# Altium footprint library GBA.PcbLib: 115 footprints (part 7 of 8)
Each footprint in its own frame and in the unit in brackets; x right, y up, seen from the top. Pads: shape width x height; smd on the part's side, far side on the other; paste and mask are expansions set on the pad; w line width, h text height; cw(c..) or ccw(c..) is an arc to the next point about the centre after c.
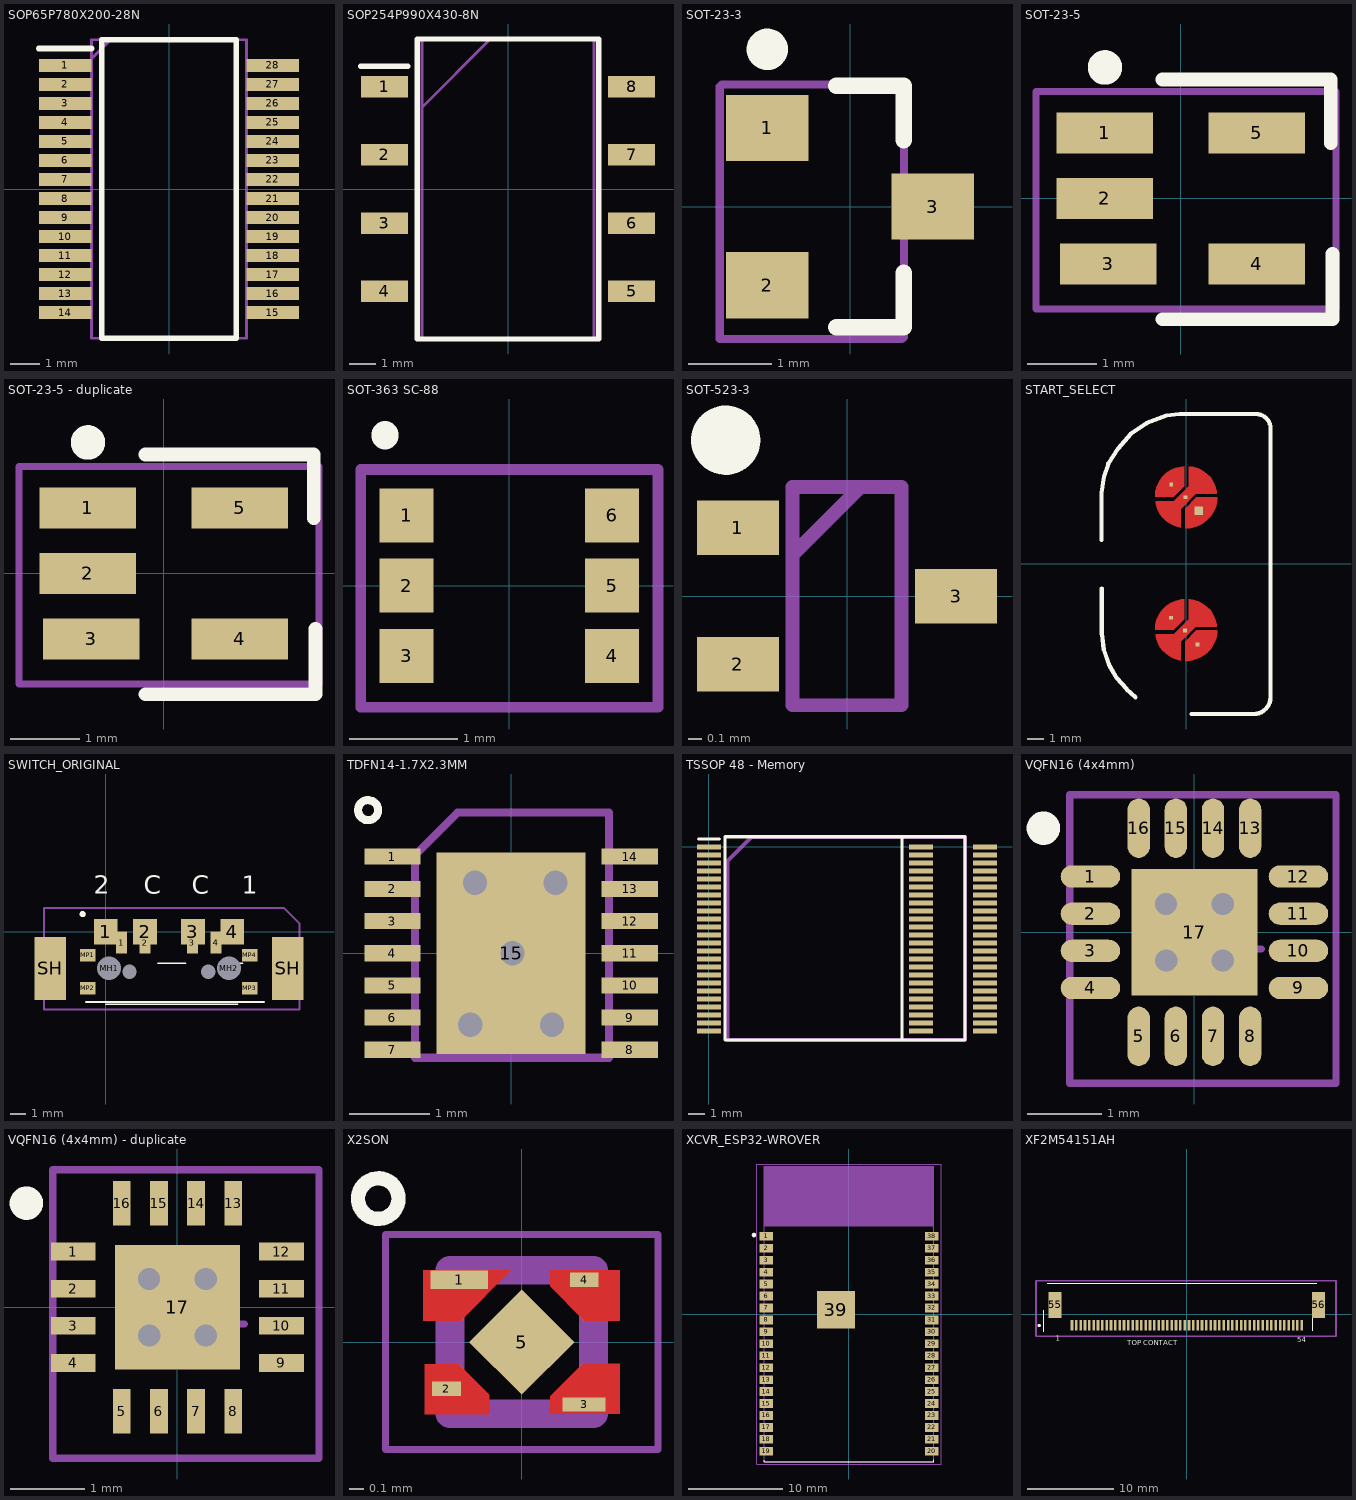
[diagram p6: the footprints below, top view; thin cyan lines are the x and y axes]

## SOP65P780X200-28N [mm]
pads (28):
  rect 1.8x0.45 smd: 1(-3.55,4.225) 2(-3.55,3.575) 3(-3.55,2.925) 4(-3.55,2.275) 5(-3.55,1.625) 6(-3.55,0.975) 7(-3.55,0.325) 8(-3.55,-0.325) 9(-3.55,-0.975) 10(-3.55,-1.625) 11(-3.55,-2.275) 12(-3.55,-2.925) 13(-3.55,-3.575) 14(-3.55,-4.225) 15(3.55,-4.225) 16(3.55,-3.575) 17(3.55,-2.925) 18(3.55,-2.275) 19(3.55,-1.625) 20(3.55,-0.975) 21(3.55,-0.325) 22(3.55,0.325) 23(3.55,0.975) 24(3.55,1.625) 25(3.55,2.275) 26(3.55,2.925) 27(3.55,3.575) 28(3.55,4.225)
Top Overlay:
  lines w0.2: -4.45,4.8 -2.65,4.8 ; -2.3,-5.1 2.3,-5.1 2.3,5.1 -2.3,5.1 -2.3,-5.1
Top Designator:
  lines w0.1: -2.65,4.45 -2,5.1 ; -2.65,-5.1 2.65,-5.1 2.65,5.1 -2.65,5.1 -2.65,-5.1
  text ".Designator" at 0.066,-1.905 h1
3D body "PCM2704CDBR.stp": height 1.9, standoff 0, extent -3.9,-5.1 3.9,5.1

## SOP254P990X430-8N [mm]
pads (8):
  rect 1.75x0.8 smd: 1(-4.6,3.81) 2(-4.6,1.27) 3(-4.6,-1.27) 4(-4.6,-3.81) 5(4.6,-3.81) 6(4.6,-1.27) 7(4.6,1.27) 8(4.6,3.81)
Top Overlay:
  lines w0.2: -5.475,4.56 -3.725,4.56 ; -3.375,-5.58 -3.375,5.58 3.375,5.58 3.375,-5.58 -3.375,-5.58
Top Designator:
  lines w0.1: -3.2,3.04 -0.66,5.58 ; -3.2,-5.58 3.2,-5.58 3.2,5.58 -3.2,5.58 -3.2,-5.58
  text ".Designator" at -0.569,-1.397 h1
3D body "CUI_DEVICES_DS04-254-2-04BK-SMT.step": height -0.39, standoff -4.39, extent -4.696,-5.572 5.204,5.588

## SOT-23-3 [mm] "SOT23, 3-Leads, Body 2.92x1.3mm, Pitch 0.95mm"
height 1.11
pads (3):
  rect 1x0.8 smd: 1(-1,0.95) 2(-1,-0.95) 3(1,0)
Top Overlay:
  circle w0.25: c-1,1.9 r0.125
  lines w0.2: -0.165,-1.46 0.65,-1.46 0.65,-0.8 ; -0.165,1.46 0.65,1.46 0.65,0.8
Top Designator (Mech29):
  lines w0.1: -1.575,-1.6 0.625,-1.6 0.65,-1.575 0.65,1.475 -1.55,1.475 -1.575,1.45 -1.575,-1.6
  text ".Designator" at -0.8,1.125 h1
3D body "SOT23-3.step": height 1.3, standoff 0, extent -1.4,-1.45 1.4,1.45

## SOT-23-5 [mm] "SOT23, 3-Leads, Body 2.92x1.3mm, Pitch 0.95mm"
height 1.11
pads (5):
  rect 1.4x0.6 smd: 1(-1.1,0.95) 2(-1.1,0) 3(-1.05,-0.95) 4(1.1,-0.95) 5(1.1,0.95)
Top Overlay:
  circle w0.25: c-1.1,1.9 r0.125
  lines w0.2: -0.265,-1.75 2.2,-1.75 2.2,-0.8 ; -0.265,1.725 2.175,1.725 2.175,0.8
Top Designator (Mech29):
  lines w0.1: -2.1,-1.6 2.25,-1.6 2.25,1.55 -2.1,1.55 -2.1,-1.6
  text ".Designator" at -0.9,1.125 h1
3D body "SOT-23-5.step": height 1.05, standoff -0.05, extent -1.175,-1.5 1.325,1.5

## SOT-23-5 - duplicate [mm] "SOT23, 3-Leads, Body 2.92x1.3mm, Pitch 0.95mm"
height 1.11
pads (5):
  rect 1.4x0.6 smd: 1(-1.1,0.95) 2(-1.1,0) 3(-1.05,-0.95) 4(1.1,-0.95) 5(1.1,0.95)
Top Overlay:
  circle w0.25: c-1.1,1.9 r0.125
  lines w0.2: -0.265,-1.75 2.2,-1.75 2.2,-0.8 ; -0.265,1.725 2.175,1.725 2.175,0.8
Top Designator (Mech29):
  lines w0.1: -2.1,-1.6 2.25,-1.6 2.25,1.55 -2.1,1.55 -2.1,-1.6
  text ".Designator" at -0.9,1.125 h1
3D body "SOT-23-5.step": height 1.05, standoff -0.05, extent -1.175,-1.5 1.325,1.5

## SOT-363 SC-88 [mm] "SOT23, 3-Leads, Body 2.92x1.3mm, Pitch 0.95mm"
height 1.11
pads (6):
  rect 0.5x0.5 smd: 1(-0.95,0.65) 2(-0.95,0) 3(-0.95,-0.65) 4(0.95,-0.65) 5(0.95,0) 6(0.95,0.65)
Top Overlay:
  lines w0.25: -1.151,1.384 ccw(c-1.275,1.4) -1.15,1.4
Top Designator (Mech29):
  lines w0.1: -1.375,-1.125 1.375,-1.125 1.375,1.075 -1.375,1.075 -1.375,-1.125
  text ".Designator" at -0.75,0.825 h1
3D body "SC88-6 sot363.step": height 1.1, standoff 0, extent -1.1,-1 1.1,1

## SOT-523-3 [mm]
pads (3):
  rect 0.6x0.4 smd: 1(-0.8,0.5) 2(-0.8,-0.5) 3(0.8,0)
Top Overlay:
  circle w0.254: c-0.889,1.143 r0.127
Top Designator (Mech29):
  lines w0.1: -0.4,0.3 0.1,0.8 ; -0.4,-0.8 -0.4,0.8 0.4,0.8 0.4,-0.8 -0.4,-0.8
  text ".Designator" at -1.397,-0.381 h1
3D body "DMG1012T-7.stp": height 0.8, standoff 0, extent -0.8,-0.8 0.8,0.8

## START_SELECT [mm]
pads (6):
  rect 0.23x0.23 smd: GND(-0.919,-3.263) GND(-0.896,4.756) GND(0.689,-4.871) SEL(-0.069,-4.021) STR(-0.046,3.998)
  rect 0.5x0.5 smd: GND(0.762,3.175)
Top Layer:
  region: -1.846,3.753 -0.744,3.753 0.154,4.65 0.154,5.844 0.281,5.844 0.434,5.824 0.729,5.733 1.004,5.594 1.252,5.41 1.465,5.187 1.637,4.931 1.764,4.65 1.841,4.351 1.854,4.198 0.584,4.198 -0.314,3.278 -0.314,2.159 -0.453,2.183 -0.721,2.27 -0.972,2.397 -1.202,2.559 -1.406,2.753 -1.578,2.976 -1.716,3.221 -1.816,3.485 -1.846,3.622
  region: -0.053,2.13 -0.053,3.289 0.616,3.982 1.872,3.982 1.868,3.806 1.795,3.46 1.659,3.133 1.466,2.838 1.221,2.583 0.934,2.377 0.613,2.228 0.271,2.141 0.094,2.13
  region: -1.868,4.014 -0.749,4.014 -0.131,4.657 -0.131,5.849 -0.295,5.842 -0.616,5.769 -0.919,5.64 -1.194,5.459 -1.432,5.231 -1.626,4.964 -1.768,4.667 -1.854,4.349 -1.868,4.185
  region: -1.846,-4.244 -0.744,-4.244 0.154,-3.346 0.154,-2.153 0.281,-2.153 0.434,-2.172 0.729,-2.263 1.004,-2.402 1.252,-2.586 1.465,-2.809 1.637,-3.065 1.764,-3.346 1.841,-3.645 1.854,-3.799 0.584,-3.799 -0.314,-4.718 -0.314,-5.837 -0.453,-5.813 -0.721,-5.726 -0.972,-5.599 -1.202,-5.437 -1.406,-5.243 -1.578,-5.02 -1.716,-4.775 -1.816,-4.512 -1.846,-4.374
  region: -0.053,-5.866 -0.053,-4.707 0.616,-4.014 1.872,-4.014 1.868,-4.19 1.795,-4.536 1.659,-4.862 1.466,-5.158 1.221,-5.413 0.934,-5.619 0.613,-5.768 0.271,-5.855 0.094,-5.866
  region: -1.868,-3.982 -0.749,-3.982 -0.131,-3.339 -0.131,-2.148 -0.295,-2.154 -0.616,-2.227 -0.919,-2.356 -1.194,-2.537 -1.432,-2.765 -1.626,-3.032 -1.768,-3.329 -1.854,-3.647 -1.868,-3.811
Top Overlay:
  lines w0.253: -5.101,1.425 -5.101,4.251 -4.94,5.239 -4.687,6.02 -4.09,6.939 -3.332,7.812 -2.39,8.456 -1.195,8.915 -0.391,9.007 4.205,9.007 cw(c4.205,8.134) 5.078,8.134 5.078,-8.042 cw(c4.067,-8.042) 4.067,-9.053 0.322,-9.053 ; -5.078,-1.494 -5.078,-4.251 -4.963,-5.17 -4.618,-6.158 -4.182,-6.893 -3.584,-7.56 -3.056,-8.042
Top Designator:
  text ".Designator" at 0.635,-3.81 h2

## SWITCH_ORIGINAL [mm]
pads (18):
  rect 1.5x1.6 smd: 1(0,0) 2(2.489,0) 3(5.537,0) 4(8.026,0)
  rect 0.7x1.4 smd: 1(1.002,-0.69) 2(2.502,-0.69) 3(5.502,-0.69) 4(7.002,-0.69)
  round 1.27 hole 1.5 unplated: MH1(0.203,-2.324) MH2(7.823,-2.324)
  round 0.45 hole 0.9 unplated: MH1(1.502,-2.54) MH2(6.502,-2.54)
  rect 1x0.8 smd: MP1(-1.148,-1.49) MP2(-1.148,-3.59) MP3(9.152,-3.59) MP4(9.152,-1.49)
  rect 2x4 smd: SH(-3.518,-2.324) SH(11.544,-2.324)
Top Overlay:
  lines w0.1: -0.309,-2.002 0.591,-2.002 ; -0.009,-4.602 8.391,-4.602 ; 3.291,-2.002 5.091,-2.002 ; 7.791,-2.002 8.691,-2.002
  lines w0.127: -1.253,-4.473 10.05,-4.473
  lines w0.2: -1.576,1.122 cw(c-1.476,1.122) -1.376,1.122 cw(c-1.476,1.122) -1.576,1.122
  text "1" at 8.636,2.032 h2
  text "2" at -0.762,2.032 h2
  text "C" at 2.413,2.032 h2
  text "C" at 5.461,2.032 h2
Top Designator:
  lines w0.127: -3.937,-4.953 -3.937,-3.683 -3.937,1.524 11.303,1.524 12.319,0.508 12.319,-4.953 -3.937,-4.953
  text ".Designator" at 2.413,-3.302 h1
3D body "EG1315AA.stp": height 1.41, standoff -0.49, extent -1.299,-5.253 9.401,-0.353

## TDFN14-1.7X2.3MM [mm] "T1433+2C Maxim code"
height 1.1
pads (15):
  rect 0.7x0.2 smd: 1(-1.475,1.2) 2(-1.475,0.8) 3(-1.475,0.4) 4(-1.475,0) 5(-1.475,-0.4) 6(-1.475,-0.8) 7(-1.475,-1.2) 8(1.475,-1.2) 9(1.475,-0.8) 10(1.475,-0.4) 11(1.475,0) 12(1.475,0.4) 13(1.475,0.8) 14(1.475,1.2)
  rect 1.85x2.5 smd: 15(0,0)
via 0.015,0 diameter 0.5 hole 0.3
via 0.508,-0.889 diameter 0.5 hole 0.3
via -0.508,-0.889 diameter 0.5 hole 0.3
via 0.55,0.875 diameter 0.5 hole 0.3
via -0.45,0.875 diameter 0.5 hole 0.3
Top Overlay:
  circle w0.1: c-1.778,1.778 r0.125
Top Designator (Mech29):
  lines w0.1: -1.195,-1.299 -1.195,1.218 -0.664,1.749 1.218,1.749 1.218,-1.299 -1.195,-1.299
  text ".Designator" at 0.329,-1.045 h1
3D body "MAXIM-TDFN-EP-14.step": height 0.73, standoff -0.03, extent -1.535,-1.5 1.475,1.5

## TSSOP 48 - Memory [mm]
pads (72):
  rect 1.5x0.3 smd: 1(0,0) 2(0,-0.5) 3(0,-1) 4(0,-1.5) 5(0,-2) 6(0,-2.5) 7(0,-3) 8(0,-3.5) 9(0,-4) 10(0,-4.5) 11(0,-5) 12(0,-5.5) 13(0,-6) 14(0,-6.5) 15(0,-7) 16(0,-7.5) 17(0,-8) 18(0,-8.5) 19(0,-9) 20(0,-9.5) 21(0,-10) 22(0,-10.5) 23(0,-11) 24(0,-11.5) 25(13.25,-11.5) 25(17.25,-11.5) 26(13.25,-11) 26(17.25,-11) 27(13.25,-10.5) 27(17.25,-10.5) 28(13.25,-10) 28(17.25,-10) 29(13.25,-9.5) 29(17.25,-9.5) 30(13.25,-9) 30(17.25,-9) 31(13.25,-8.5) 31(17.25,-8.5) 32(13.25,-8) 32(17.25,-8) 33(13.25,-7.5) 33(17.25,-7.5) 34(13.25,-7) 34(17.25,-7) 35(13.25,-6.5) 35(17.25,-6.5) 36(13.25,-6) 36(17.25,-6) 37(13.25,-5.5) 37(17.25,-5.5) 38(13.25,-5) 38(17.25,-5) 39(13.25,-4.5) 39(17.25,-4.5) 40(13.25,-4) 40(17.25,-4) 41(13.25,-3.5) 41(17.25,-3.5) 42(13.25,-3) 42(17.25,-3) 43(13.25,-2.5) 43(17.25,-2.5) 44(13.25,-2) 44(17.25,-2) 45(13.25,-1.5) 45(17.25,-1.5) 46(13.25,-1) 46(17.25,-1) 47(13.25,-0.5) 47(17.25,-0.5) 48(13.25,0) 48(17.25,0)
Top Overlay:
  lines w0.2: -0.65,0.5 0.65,0.5 ; 12.065,-12.065 12.065,0.635 ; 1,-12.065 16.002,-12.065 16.002,0.635 1,0.635 1,-12.065
Top Designator:
  lines w0.254: 1.143,-12.065 1.524,-12.065 16.002,-12.065 16.002,0.635 2.667,0.635 1.143,-0.889 1.143,-12.065
  text ".Designator" at 3.973,-7.084 h1

## VQFN16 (4x4mm) [mm] "QFN, 16-Leads, Body 4,00x4,00mm,"
height 0.8
pads (17):
  oval 0.8x0.3 smd: 1(-1.4,0.75) 2(-1.4,0.25) 3(-1.4,-0.25) 4(-1.4,-0.75) 9(1.4,-0.75) 10(1.4,-0.25) 11(1.4,0.25) 12(1.4,0.75)
  oval 0.3x0.8 smd: 5(-0.75,-1.4) 6(-0.25,-1.4) 7(0.25,-1.4) 8(0.75,-1.4) 13(0.75,1.4) 14(0.25,1.4) 15(-0.25,1.4) 16(-0.75,1.4)
  rect 1.7x1.7 smd: 17(0,0)
via -0.381,-0.381 diameter 0.5 hole 0.3
via 0.381,-0.381 diameter 0.5 hole 0.3
via 0.381,0.381 diameter 0.5 hole 0.3
via -0.384,0.381 diameter 0.5 hole 0.3
Top Overlay:
  circle w0.25: c-2.032,1.4 r0.1
Mechanical 15:
  lines w0.1: -0.1,-0.225 0.9,-0.225 ; 0.4,-0.725 0.4,0.275
Top Designator (Mech29):
  lines w0.1: -1.675,-2.032 -1.675,1.85 1.905,1.85 1.905,-2.032 -1.675,-2.032
  text ".Designator" at -1.124,-0.606 h1
3D body "BQ24076RGTT.stp": height 1, standoff 0, extent -1.55,-1.55 1.55,1.55

## VQFN16 (4x4mm) - duplicate [mm] "QFN, 16-Leads, Body 4,00x4,00mm,"
height 0.8
pads (17):
  rect 0.6x0.24 smd: 1(-1.4,0.75) 2(-1.4,0.25) 3(-1.4,-0.25) 4(-1.4,-0.75) 9(1.4,-0.75) 10(1.4,-0.25) 11(1.4,0.25) 12(1.4,0.75)
  rect 0.24x0.6 smd: 5(-0.75,-1.4) 6(-0.25,-1.4) 7(0.25,-1.4) 8(0.75,-1.4) 13(0.75,1.4) 14(0.25,1.4) 15(-0.25,1.4) 16(-0.75,1.4)
  rect 1.68x1.68 smd: 17(0,0)
via -0.384,0.381 diameter 0.5 hole 0.3
via 0.381,0.381 diameter 0.5 hole 0.3
via 0.381,-0.381 diameter 0.5 hole 0.3
via -0.381,-0.381 diameter 0.5 hole 0.3
Top Overlay:
  circle w0.25: c-2.032,1.4 r0.1
Mechanical 15:
  lines w0.1: -0.1,-0.225 0.9,-0.225 ; 0.4,-0.725 0.4,0.275
Top Designator (Mech29):
  lines w0.1: -1.675,-2.032 1.905,-2.032 1.905,1.85 -1.675,1.85 -1.675,-2.032
  text ".Designator" at -1.124,-0.606 h1
3D body "BQ24076RGTT.stp": height 1, standoff 0, extent -1.55,-1.55 1.55,1.55

## X2SON [mm]
pads (5):
  rect 0.4x0.13 smd: 1(-0.435,0.435)
  rect 0.2x0.1 smd: 2(-0.525,-0.325) 4(0.435,0.435)
  rect 0.3x0.1 smd: 3(0.435,-0.435)
  rect 0.52x0.52 smd rot 135: 5(0,0)
Top Layer:
  region: -0.225,-0.366 -0.225,-0.504 -0.675,-0.504 -0.675,-0.383 -0.675,-0.154 -0.437,-0.154
  region: 0.2,0.388 0.2,0.5 0.685,0.5 0.685,0.375 0.685,0.15 0.438,0.15
  region: 0.198,-0.379 0.198,-0.5 0.685,-0.5 0.685,-0.375 0.685,-0.15 0.427,-0.15
  region: -0.075,0.5 -0.685,0.5 -0.685,0.15 -0.425,0.15
Top Overlay:
  circle w0.1: c-1,1 r0.141
Top Paste:
  region: 0,0.354 0.354,0 0,-0.354 -0.354,0
  region: 0.66,0.475 0.66,0.175 0.42,0.175 0.21,0.385 0.21,0.475
  region: 0.66,-0.175 0.66,-0.475 0.21,-0.475 0.21,-0.385 0.42,-0.175
  region: -0.66,0.475 -0.12,0.475 -0.42,0.175 -0.66,0.175
  lines w0: -0.66,0.475 -0.66,0.175 -0.42,0.175 ; -0.66,-0.475 -0.66,-0.175 -0.42,-0.175 -0.21,-0.385 -0.21,-0.475 -0.66,-0.475 ; 0.21,-0.475 0.66,-0.475 0.66,-0.175 0.42,-0.175 0.21,-0.385 0.21,-0.475
Top Solder:
  region: 0,0.46 0.46,0 0,-0.46 -0.46,0
  region: -0.66,0.475 -0.66,0.175 -0.41,0.175 -0.11,0.475
Bottom 3D Body (Mech4):
  lines w0.2: -0.5,-0.5 0.5,-0.5 ; -0.5,-0.5 -0.5,0.5 ; -0.5,-0.5 0.5,-0.5 ; -0.5,-0.5 -0.5,0.5 ; -0.5,0.5 0.5,0.5 ; -0.5,0.5 0.5,0.5 ; 0.5,-0.5 0.5,0.5 ; 0.5,-0.5 0.5,0.5
Top Designator (Mech29):
  lines w0.05: -0.95,-0.75 0.95,-0.75 0.95,0.75 -0.95,0.75 -0.95,-0.75
  text ".Designator" at -0.5,0 h0.8
3D body "on-XDFN4-711AJ.step": height 0.36, standoff -0.03, extent -0.5,-0.502 0.5,0.502

## XCVR_ESP32-WROVER [mm]
pads (39):
  rect 1.45x0.93 smd: 1(-8.81,8.26) 2(-8.81,6.99) 3(-8.81,5.72) 4(-8.81,4.45) 5(-8.81,3.18) 6(-8.81,1.91) 7(-8.81,0.64) 8(-8.81,-0.63) 9(-8.81,-1.9) 10(-8.81,-3.17) 11(-8.81,-4.44) 12(-8.81,-5.71) 13(-8.81,-6.98) 14(-8.81,-8.25) 15(-8.81,-9.52) 16(-8.81,-10.79) 17(-8.81,-12.06) 18(-8.81,-13.33) 19(-8.81,-14.6) 20(8.81,-14.6) 21(8.81,-13.33) 22(8.81,-12.06) 23(8.81,-10.79) 24(8.81,-9.52) 25(8.81,-8.25) 26(8.81,-6.98) 27(8.81,-5.71) 28(8.81,-4.44) 29(8.81,-3.17) 30(8.81,-1.9) 31(8.81,-0.63) 32(8.81,0.64) 33(8.81,1.91) 34(8.81,3.18) 35(8.81,4.45) 36(8.81,5.72) 37(8.81,6.99) 38(8.81,8.26)
  rect 4x4 smd: 39(-1.38,0.47)
Top Overlay:
  circle w0.24: c-10.1,8.4 r0.12
  lines w0.127: -9,-15.55 -9,-15.7 9,-15.7 9,-15.5
Top Paste:
  region: -2.648,1.735 -0.115,1.735 -0.115,-0.796 -2.648,-0.796
Bottom 3D Body (Mech4):
  region: -9.029,15.7 9,15.7 9,9.33 -9.029,9.33
  region: -9.03,15.7 9,15.7 9,9.331 -9.03,9.331
  region: -9.023,15.7 9,15.7 9,9.324 -9.023,9.324
  region: -9.029,15.7 9,15.7 9,9.33 -9.029,9.33
  region: -9.03,15.7 9,15.7 9,9.331 -9.03,9.331
  region: -9.023,15.7 9,15.7 9,9.324 -9.023,9.324
  lines w0.127: -9,-15.7 -9,15.7 ; -9,-15.7 9,-15.7 ; -9,-15.7 -9,15.7 ; -9,-15.7 9,-15.7 ; -9,15.7 9,15.7 ; -9,15.7 9,15.7 ; 9,-15.7 9,15.7 ; 9,-15.7 9,15.7
Top Designator (Mech29):
  lines w0.05: -9.8,-15.95 -9.8,15.95 9.8,15.95 9.8,-15.95 -9.8,-15.95
  lines w0.127: -9,8.95 -9,15.7 9,15.7 9,8.95
  text ".Designator" at -6,-10 h0.8
3D body "ESP32-WROVER-B (16MB).STEP": height 3.4, standoff 0, extent -9,-15.7 9,15.7

## XF2M54151AH [mm]
pads (56):
  rect 0.3x1.2 smd: 1(-13.25,-1.25) 2(-12.75,-1.25) 3(-12.25,-1.25) 4(-11.75,-1.25) 5(-11.25,-1.25) 6(-10.75,-1.25) 7(-10.25,-1.25) 8(-9.75,-1.25) 9(-9.25,-1.25) 10(-8.75,-1.25) 11(-8.25,-1.25) 12(-7.75,-1.25) 13(-7.25,-1.25) 14(-6.75,-1.25) 15(-6.25,-1.25) 16(-5.75,-1.25) 17(-5.25,-1.25) 18(-4.75,-1.25) 19(-4.25,-1.25) 20(-3.75,-1.25) 21(-3.25,-1.25) 22(-2.75,-1.25) 23(-2.25,-1.25) 24(-1.75,-1.25) 25(-1.25,-1.25) 26(-0.75,-1.25) 27(-0.25,-1.25) 28(0.25,-1.25) 29(0.75,-1.25) 30(1.25,-1.25) 31(1.75,-1.25) 32(2.25,-1.25) 33(2.75,-1.25) 34(3.25,-1.25) 35(3.75,-1.25) 36(4.25,-1.25) 37(4.75,-1.25) 38(5.25,-1.25) 39(5.75,-1.25) 40(6.25,-1.25) 41(6.75,-1.25) 42(7.25,-1.25) 43(7.75,-1.25) 44(8.25,-1.25) 45(8.75,-1.25) 46(9.25,-1.25) 47(9.75,-1.25) 48(10.25,-1.25) 49(10.75,-1.25) 50(11.25,-1.25) 51(11.75,-1.25) 52(12.25,-1.25) 53(12.75,-1.25) 54(13.25,-1.25)
  rect 1.5x3 smd: 55(-15.2,1.1) 56(15.2,1.1)
Top Overlay:
  lines w0.1: -16.494,-2.009 -16.494,0.491 ; -16.113,3.579 14.987,3.579 ; 14.494,-1.882 14.494,0.618
  lines w0.2: -17.145,-1.27 cw(c-17.045,-1.27) -16.945,-1.27 cw(c-17.045,-1.27) -17.042,-1.17
  text "54" at 12.716,-3.406 h1
  text "1" at -15.097,-3.279 h1
  text "TOP CONTACT" at -6.884,-3.79 h1
Mechanical 13:
  lines w0.2: -17.4,-2.517 17.2,-2.517 17.2,3.9 -17.4,3.9 -17.4,-2.517
Top Designator (Mech29):
  text ".Designator" at -6.969,0.404 h1
3D body "F32Q-1A7H1-11054--3DModel-STEP-533217.STEP": height 2.05, standoff 0, extent -17.148,-1.305 17.152,4.195